# Altium footprint library THD Connectors-1.PcbLib: 129 footprints (part 1 of 9)
Each footprint in its own frame and in the unit in brackets; x right, y up, seen from the top. Pads: shape width x height; smd on the part's side, far side on the other; paste and mask are expansions set on the pad; w line width, h text height; cw(c..) or ccw(c..) is an arc to the next point about the centre after c.
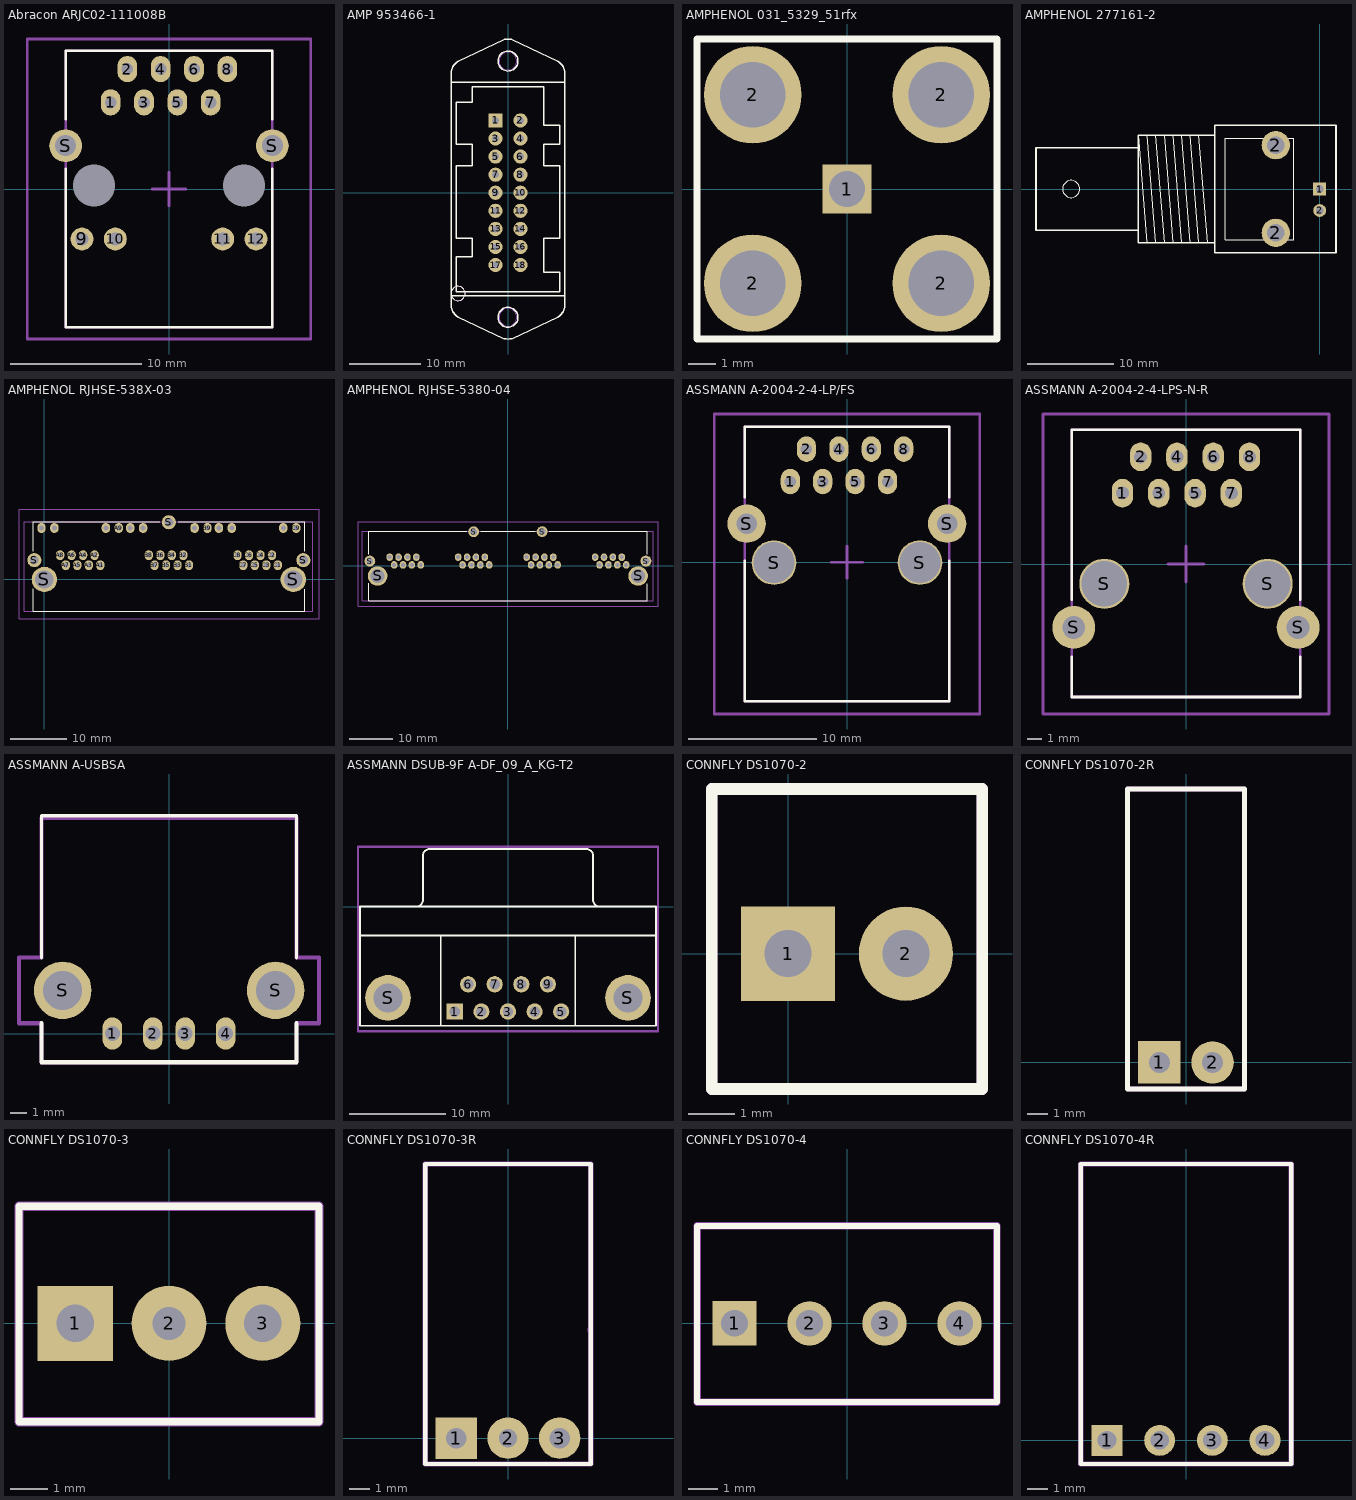
[diagram p0: the footprints below, top view; thin cyan lines are the x and y axes]

## Abracon ARJC02-111008B [mm]
height 13.55
pads (16):
  oval 1.5x2 hole 0.9: 1(-4.445,6.6) 2(-3.175,9.14) 3(-1.905,6.6) 4(-0.635,9.14) 5(0.635,6.6) 6(1.905,9.14) 7(3.175,6.6) 8(4.445,9.14)
  round 1.75 hole 1.02: 9(-6.63,-3.81) 10(-4.09,-3.81) 11(4.09,-3.81) 12(6.63,-3.81)
  round 0 hole 3.2 unplated: M(-5.715,0.25) M(5.715,0.25)
  round 2.5 hole 1.6: S(-7.875,3.3) S(7.875,3.3)
Top Overlay:
  lines w0.2: -7.874,1.52 -7.874,-10.545 0,-10.545 7.874,-10.545 7.874,1.52 ; -7.874,5.33 -7.874,10.537 0,10.537 7.874,10.537 7.874,5.33
Mechanical 1:
  lines w0.2: -7.874,-10.545 7.874,-10.545 7.874,10.537 -7.874,10.537 -7.874,-10.545
Mechanical 15:
  lines w0.2: -1.27,0 1.27,0 ; 0,-1.27 0,1.27 ; -10.795,-11.43 10.795,-11.43 10.795,11.43 -10.795,11.43 -10.795,-11.43
3D body "Abracon ARJC02-111008B.STEP": height 16.07, standoff -3.7, extent -10.336,-10.555 10.336,10.546

## AMP 953466-1 [mm]
height 20
pads (18):
  rect 2x2 hole 1: 1(-1.75,10.16)
  round 2 hole 1: 2(1.75,10.16) 3(-1.75,7.62) 4(1.75,7.62) 5(-1.75,5.08) 6(1.75,5.08) 7(-1.75,2.54) 8(1.75,2.54) 9(-1.75,0) 10(1.75,0) 11(-1.75,-2.54) 12(1.75,-2.54) 13(-1.75,-5.08) 14(1.75,-5.08) 15(-1.75,-7.62) 16(1.75,-7.62) 17(-1.75,-10.16) 18(1.75,-10.16)
Top Overlay:
  circle w0.2: c0,-17.5 r1.4
  circle w0.2: c0,18.5 r1.4
  circle w0.1: c-7,-14.16 r1
  lines w0.2: -8,-16 -8,17 ; -8,-14.5 8,-14.5 ; -8,15.5 8,15.5 ; -7.975,-16.063 ccw(c-6,-15.75) -7,-17.482 ; -7.975,17.063 cw(c-6,16.75) -7,18.482 ; -7,-17.5 -0.6,-20.5 ; -7,18.5 -0.6,21.5 ; -0.521,-20.504 ccw(c0,-17.55) 0.521,-20.504 ; -0.521,21.554 cw(c0,18.6) 0.521,21.554 ; 0.6,-20.5 7,-17.5 ; 0.6,21.5 7,18.5 ; 7,-17.482 ccw(c6,-15.75) 7.975,-16.063 ; 7,18.482 cw(c6,16.75) 7.975,17.063 ; 8,-16 8,17 ; -7.3,-13.9 7.3,-13.9 7.3,-11.2 5,-11.2 5,-6.4 7.3,-6.4 7.3,3.8 5,3.8 5,6.8 7.3,6.8 7.3,9.5 5,9.5 5,14.9 -5,14.9 -5,12.7 -7.3,12.7 -7.3,6.8 -5,6.8 -5,3.8 -7.3,3.8 -7.3,-6.4 -5,-6.4 -5,-9 -7.3,-9 -7.3,-13.9
Mechanical 1:
  circle w0.1: c0,-17.5 r1.25
  circle w0.1: c0,18.5 r1.25
  circle w0.1: c-7,-14.16 r1
3D body "AMP 953466-1.STEP": height 21.59, standoff -3.76, extent -9.779,-20.619 9.371,21.381

## AMPHENOL 031_5329_51rfx [mil]
pads (5):
  rect 70x70 hole 51: 1(0,0)
  round 140 hole 94: 2(-135,-135) 2(-135,135) 2(135,-135) 2(135,135)
Top Overlay:
  lines w10: -215,-215 -215,215 215,215 215,-215 -215,-215
3D body "Amphenol Coax 031-5329-51rfx.STEP": height 660, standoff -170.71, extent -216.53,-216.53 216.53,216.53

## AMPHENOL 277161-2 [mm]
pads (4):
  rect 1.5x1.5 hole 0.9: 1(0,0)
  round 3.3 hole 2: 2(-5.1,-5.1) 2(-5.1,5.1)
  round 1.5 hole 0.9: 2(0,-2.5)
Top Overlay:
  circle w0.025: c-28.9,0 r1
  lines w0.025: -20.1,-6.25 -21.1,6.25 ; -20.1,6.25 -19.1,-6.25 ; -19.1,6.25 -18.1,-6.25 ; -18.1,6.25 -17.1,-6.25 ; -17.1,6.25 -16.1,-6.25 ; -16.1,6.25 -15.1,-6.25 ; -15.1,6.25 -14.1,-6.25 ; -14.1,6.25 -13.1,-6.25 ; -21.1,-4.8 -21.1,-6.25 -12.2,-6.25 ; -21.1,-4.8 -21.1,4.8 ; -21.1,-4.8 -33,-4.8 -33,4.8 -21.1,4.8 ; -21.1,4.8 -21.1,6.25 ; -21.1,6.25 -12.2,6.25 ; -12.2,-6.25 -12.2,-7.4 1.9,-7.4 1.9,7.4 -12.2,7.4 -12.2,6.25 ; -12.2,-6.25 -12.2,6.25 ; -11,-5.9 -11,5.9 -3,5.9 -3,-5.9 -11,-5.9
  lines w0.2: -21.1,-4.8 -21.1,-6.25 -12.2,-6.25 ; -21.1,-4.8 -33,-4.8 -33,4.8 -21.1,4.8 ; -21.1,-4.8 -21.1,4.8 ; -21.1,4.8 -21.1,6.25 -12.2,6.25 ; -12.2,-6.25 -12.2,-7.4 1.9,-7.4 1.9,7.4 -12.2,7.4 -12.2,6.25 ; -12.2,-6.25 -12.2,6.25
3D body "BNC AMPHENOL 227161-2.step": height 15.16, standoff -4.32, extent -32.766,-7.506 2.286,7.252

## AMPHENOL RJHSE-538X-03 [mm]
height 13.46
pads (41):
  oval 1.5x1.75 hole 0.9: A1(9.93,2.54) A2(8.91,4.32) A3(7.89,2.54) A4(6.87,4.32) A5(5.85,2.54) A6(4.83,4.32) A7(3.81,2.54) A8(2.79,4.32) A9(13.21,9.14) A10(10.92,9.14) A11(1.78,9.14) A12(-0.51,9.14) B1(25.68,2.54) B2(24.66,4.32) B3(23.64,2.54) B4(22.62,4.32) B5(21.6,2.54) B6(20.58,4.32) B7(19.56,2.54) B8(18.54,4.32) B9(28.96,9.14) B10(26.67,9.14) B11(17.53,9.14) B12(15.24,9.14) C1(41.43,2.54) C2(40.41,4.32) C3(39.39,2.54) C4(38.37,4.32) C5(37.35,2.54) C6(36.33,4.32) C7(35.31,2.54) C8(34.29,4.32) C9(44.71,9.14) C10(42.42,9.14) C11(33.28,9.14) C12(30.99,9.14)
  round 2.5 hole 1.57: S(-1.78,3.43) S(22.1,10.16) S(45.98,3.43)
  round 4.5 hole 3.25: S(0,0) S(44.2,0)
Top Overlay:
  lines w0.2: -2,-1.675 -2,-5.65 46.25,-5.65 ; -2,5 -2,10.25 20.5,10.25 ; 23.75,10.25 46.25,10.25 ; 46.26,-5.65 46.26,-1.75 ; 46.26,5 46.26,10.25 ; 20.5,10.25 20.5,10.25
Mechanical 1:
  lines w0.2: 47.67,10.25 -3.525,10.25 -3.525,-5.65 47.686,-5.65 47.686,10.235
Mechanical 15:
  lines w0.2: -4.5,-7 -4.5,12.5 48.76,12.5 48.76,-7 -4.5,-7
3D body "Amphenol RJHSE-538X-03-REVT1.STEP": height 14.47, standoff -4.44, extent -3.345,-6.108 47.825,10.481

## AMPHENOL RJHSE-5380-04 [mm]
height 13.46
pads (38):
  oval 1.5x1.75 hole 0.9: A1(-20.04,0.24) A2(-21.06,2.02) A3(-22.08,0.24) A4(-23.1,2.02) A5(-24.12,0.24) A6(-25.14,2.02) A7(-26.16,0.24) A8(-27.18,2.02) B1(-4.29,0.24) B2(-5.31,2.02) B3(-6.33,0.24) B4(-7.35,2.02) B5(-8.37,0.24) B6(-9.39,2.02) B7(-10.41,0.24) B8(-11.43,2.02) C1(11.46,0.24) C2(10.44,2.02) C3(9.42,0.24) C4(8.4,2.02) C5(7.38,0.24) C6(6.36,2.02) C7(5.34,0.24) C8(4.32,2.02) D1(27.21,0.24) D2(26.19,2.02) D3(25.17,0.24) D4(24.15,2.02) D5(23.13,0.24) D6(22.11,2.02) D7(21.09,0.24) D8(20.07,2.02)
  round 2.5 hole 1.57: S(-31.75,1.13) S(-7.87,7.86) S(7.88,7.89) S(31.75,1.13)
  round 4.5 hole 3.25: S(-29.97,-2.3) S(29.97,-2.3)
Top Overlay:
  lines w0.2: -31.97,-3.975 -31.97,-7.95 32.03,-7.95 32.03,-4.05 ; -31.97,2.7 -31.97,7.95 -9.47,7.95 ; -6.22,7.95 6.28,7.95 ; 9.53,7.95 32.03,7.95 ; 32.03,2.7 32.03,7.95 ; -9.47,7.95 -9.47,7.95 ; 32.03,7.95 32.03,7.95
Mechanical 1:
  lines w0.2: -33.495,-7.95 -33.495,7.95 33.456,7.95 33.456,-7.95 -33.495,-7.95
Mechanical 15:
  lines w0.2: -34.47,-9.3 -34.47,10.2 34.53,10.2 34.53,-9.3 -34.47,-9.3
3D body "Amphenol RJHSE-5380-04-REVT1.STEP": height 14.68, standoff -4.17, extent -33.47,-8 33.481,7.9

## ASSMANN A-2004-2-4-LP/FS [mm]
height 13.3
pads (12):
  oval 1.5x2 hole 0.9: 1(-4.445,6.31) 2(-3.175,8.85) 3(-1.905,6.31) 4(-0.635,8.85) 5(0.635,6.31) 6(1.905,8.85) 7(3.175,6.31) 8(4.445,8.85)
  round 3 hole 1.6: S(-7.855,3.01) S(7.845,3.01)
  round 3.5 hole 3.2: S(-5.715,-0.04) S(5.715,-0.04)
Top Overlay:
  lines w0.2: -8,0.1 -8,-10.9 8,-10.9 8,0.1 ; -8,5.1 -8,10.6 8,10.6 8,5.1
Mechanical 1:
  lines w0.2: -8,-10.9 8,-10.9 8,10.6 -8,10.6 -8,-10.9
Mechanical 15:
  lines w0.2: -1.25,0 1.25,0 ; 0,-1.25 0,1.25 ; -10.4,-11.9 -10.4,11.6 10.4,11.6 10.4,-11.9 -10.4,-11.9
3D body "ASSMANN A-2004-2-4-LPFS-N-R.STEP": height 13.6, standoff -3.5, extent -8,-10.9 8,10.6

## ASSMANN A-2004-2-4-LPS-N-R [mm]
height 13.3
pads (12):
  oval 1.5x2 hole 0.9: 1(-4.445,4.96) 2(-3.175,7.5) 3(-1.905,4.96) 4(-0.635,7.5) 5(0.635,4.96) 6(1.905,7.5) 7(3.175,4.96) 8(4.445,7.5)
  round 3 hole 1.6: S(-7.855,-4.44) S(7.845,-4.44)
  round 3.5 hole 3.2: S(-5.715,-1.39) S(5.715,-1.39)
Top Overlay:
  lines w0.2: -8,-6.5 -8,-9.3 8,-9.3 8,-6.5 ; -8,-2.5 -8,9.4 8,9.4 8,-2.5
Mechanical 1:
  lines w0.2: -8,-9.3 8,-9.3 8,9.4 -8,9.4 -8,-9.3
Mechanical 15:
  lines w0.2: -1.25,0 1.25,0 ; 0,-1.25 0,1.25 ; -10,-10.5 10,-10.5 10,10.5 -10,10.5 -10,-10.5
3D body "ASSMANN A-2004-2-4-LPS-N-R.STEP": height 13.3, standoff -3.5, extent -8,-9.3 8,9.4

## ASSMANN A-USBSA [mm]
height 11
pads (6):
  oval 1.2x2 hole 0.92: 1(-3.5,0) 2(-1,0) 3(1,0) 4(3.5,0)
  round 3.556 hole 2.413: S(-6.57,2.667) S(6.587,2.667)
Top Overlay:
  lines w0.2: -7.874,4.667 -7.874,13.462 7.874,13.462 7.874,4.667
  lines w0.254: -7.874,0.635 -7.874,-1.778 7.874,-1.778 7.874,0.635
Mechanical 15:
  lines w0.254: -9.271,0.635 -7.874,0.635 -7.874,-1.778 7.874,-1.778 7.874,0.635 9.271,0.635 9.271,4.699 7.874,4.699 7.874,13.335 -7.874,13.335 -7.874,4.699 -9.271,4.699 -9.271,0.635
3D body "ASSMANN A-USBSA.stp": height 7.51, standoff -3.35, extent -7.9,-1.143 7.9,13.357

## ASSMANN DSUB-9F A-DF_09_A_KG-T2 [mm] "Connector; D Subminiature; 9 Position; Right Angle; Pitch 1.385 mm"
height 12.75
pads (11):
  rect 1.69x1.69 hole 1.09: 1(-5.54,-10.92)
  round 1.69 hole 1.09: 2(-2.77,-10.92) 3(0,-10.92) 4(2.77,-10.92) 5(5.54,-10.92) 6(-4.155,-8.08) 7(-1.385,-8.08) 8(1.385,-8.08) 9(4.155,-8.08)
  round 4.76 hole 3.048: S(-12.495,-9.5) S(12.495,-9.5)
Top Overlay:
  lines w0.2: -15.4,-3 15.4,-3 ; -9.56,0.005 ccw(c-9.56,0.7) -8.865,0.7 -8.865,5.3 ; -8.86,5.305 cw(c-8.165,5.305) -8.165,6 8.165,6 cw(c8.165,5.305) 8.86,5.305 ; -7,-12.4 -7,-3 ; 7,-12.4 7,-3 ; 8.865,5.3 8.865,0.7 ccw(c9.56,0.7) 9.56,0.005 ; -15.4,-12.4 -15.4,0 15.4,0 15.4,-12.4 -15.4,-12.4
Mechanical 15:
  lines w0.254: -15.621,-12.954 -15.621,6.223 15.621,6.223 15.621,-12.954 -15.621,-12.954
3D body "ASSMANN connector_a-df_09_a_kg-t2.stp": height 12.62, standoff -4.25, extent -15.405,-12.5 15.405,5.8

## CONNFLY DS1070-2 [mil] "connfly electronic CO,.LTD."
pads (2):
  rect 80x80 hole 40: 1(0,0)
  round 80 hole 40: 2(100,0)
Top Overlay:
  lines w9.84: -65,-115 165,-115 165,140 -65,140 -65,-115
Mechanical 15:
  lines w10: -65,-115 -65,140 165,140 165,-115 -65,-115
3D body "WF-2.STEP": height 461.76, standoff -100.39, extent -52.36,-105 152.36,127.28

## CONNFLY DS1070-2R [mil] "connfly electronic CO,.LTD."
pads (2):
  rect 80x80 hole 40: 1(-50,0)
  round 80 hole 40: 2(50,0)
Top Overlay:
  lines w9.84: -110,-50 -110,515 110,515 110,-50 -110,-50
Mechanical 15:
  lines w10: -110,-50 110,-50 110,515 -110,515 -110,-50
3D body "WF-2R.STEP": height 228.35, standoff -133.86, extent -99.99,-10.87 100.01,508.82

## CONNFLY DS1070-3 [mil] "Connector; Header; 3 Position"
pads (3):
  rect 80x80 hole 40: 1(-100,0)
  round 80 hole 35.43: 2(0,0)
  round 80 hole 40: 3(100,0)
Top Overlay:
  lines w7.87: -160,-105 160,-105 160,125 -160,125 -160,-105
Mechanical 15:
  lines w10: -160,-105 160,-105 160,125 -160,125 -160,-105
3D body "WF-3.STEP": height 461.76, standoff -118.11, extent -153.54,-105 153.54,127.28

## CONNFLY DS1070-3R [mil] "Connector; Header; 3 Position"
pads (3):
  rect 80x80 hole 40: 1(-100,0)
  round 80 hole 35.43: 2(0,0)
  round 80 hole 40: 3(100,0)
Top Overlay:
  lines w7.87: -160,-50 160,-50 160,530 -160,530 -160,-50
Mechanical 15:
  lines w9.84: 158.46,207.68 158.46,210.63
  lines w10: -160,-50 160,-50 160,530 -160,530 -160,-50
3D body "WF-3R.STEP": height 232.28, standoff -129.92, extent -150,-11.14 150,521.14

## CONNFLY DS1070-4 [mm] "Connector; Header; 4 Position"
pads (4):
  rect 1.5x1.5 hole 0.9: 1(-3.81,0)
  round 1.5 hole 0.9: 2(-1.27,0) 3(1.27,0) 4(3.81,0)
Top Overlay:
  lines w0.2: -5.08,-2.667 -5.08,3.302 5.08,3.302 5.08,-2.667 -5.08,-2.667
Mechanical 15:
  lines w0.25: -5.08,-2.667 5.08,-2.667
  lines w0.254: -5.08,-2.667 -5.08,3.302 5.08,3.302 5.08,-2.667
3D body "WF-4.STEP": height 11.73, standoff -2.55, extent -5.08,-2.696 5.08,3.204
3D body: height 0.92, standoff -1.03, extent -1.016,3.683 -1.016,3.683
3D body: height 0.92, standoff -1.03, extent -1.905,3.683 -1.905,3.683

## CONNFLY DS1070-4R [mm] "Connector; Header; 4 Position"
pads (4):
  rect 1.5x1.5 hole 0.9: 1(-3.81,0)
  round 1.5 hole 0.9: 2(-1.27,0) 3(1.27,0) 4(3.81,0)
Top Overlay:
  lines w0.2: -5.08,-1.143 5.08,-1.143 5.08,13.335 -5.08,13.335 -5.08,-1.143
Mechanical 15:
  lines w0.25: -5.08,-1.143 5.08,-1.143
  lines w0.254: -5.08,-1.143 -5.08,13.335 5.08,13.335 5.08,-1.143
3D body: height 0.92, standoff -1.03, extent -1.905,3.683 -1.905,3.683
3D body: height 0.92, standoff -1.03, extent -1.016,3.683 -1.016,3.683
3D body "WF-4R.STEP": height 5.9, standoff -3.3, extent -5.08,-0.283 5.08,13.237